# Altium footprint library PcbLib1.PcbLib: 54 footprints (part 4 of 4)
Each footprint in its own frame and in the unit in brackets; x right, y up, seen from the top. Pads: shape width x height; smd on the part's side, far side on the other; paste and mask are expansions set on the pad; w line width, h text height; cw(c..) or ccw(c..) is an arc to the next point about the centre after c.
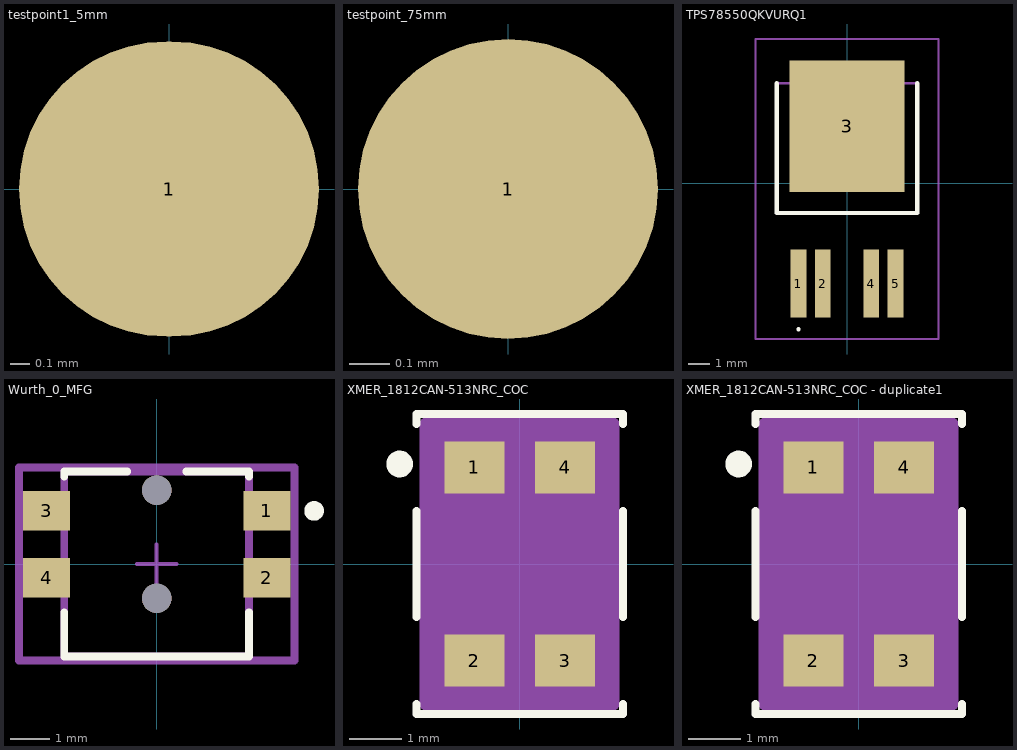
[diagram p3: the footprints below, top view; thin cyan lines are the x and y axes]

## testpoint1_5mm [mm]
pads (1):
  oval 1.524x1.5 smd: 1(0,0)

## testpoint_75mm [mm]
pads (1):
  round 0.75 smd: 1(0,0)

## TPS78550QKVURQ1 [mm]
pads (5):
  rect 0.75x3.2 smd: 1(-2.28,-4.71) 2(-1.14,-4.71) 4(1.14,-4.71) 5(2.28,-4.71)
  rect 5.4x6.2 smd: 3(0,2.69)
Top Overlay:
  lines w0.1: -2.28,-6.9 ccw(c-2.28,-6.85) -2.28,-6.8 ccw(c-2.28,-6.85) -2.28,-6.9
  lines w0.2: -3.3,4.71 -3.3,-1.385 3.3,-1.385 3.3,4.71
Mechanical 13:
  lines w0.1: -3.3,-1.385 -3.3,4.71 3.3,4.71 3.3,-1.385 -3.3,-1.385
Mechanical 15:
  lines w0.1: -4.3,-7.31 -4.3,6.79 4.3,6.79 4.3,-7.31 -4.3,-7.31
3D body "TPS78550QKVURQ1.stp": height 2.29, standoff -0.1, extent -3.291,-5.312 3.291,4.792

## Wurth_0_MFG [mm]
pads (6):
  rect 1.2x1 smd paste+0 mask+0: 1(2.8,1.35) 2(2.8,-0.35) 3(-2.8,1.35) 4(-2.8,-0.35)
  round 0.75 hole 0.75 unplated paste-2539.97 mask+0: ""(0,-0.875) ""(0,1.875)
Top Overlay:
  circle w0.25: c4,1.35 r0.125
  lines w0.2: -2.35,-1.225 -2.35,-2.35 2.35,-2.35 2.35,-1.225 ; -2.35,2.225 -2.35,2.35 -0.75,2.35 ; 0.75,2.35 2.35,2.35 2.35,2.225
Mechanical 10:
  lines w0.2: -3.5,-2.45 -3.5,2.45 3.5,2.45 3.5,-2.45 -3.5,-2.45
  text ".Designator" at 0,-0.001 h1
Mechanical 12:
  lines w0.2: -2.35,-2.35 -2.35,2.35 2.35,2.35 2.35,-2.35 -2.35,-2.35
Mechanical 15:
  lines w0.1: -0.5,0 0.5,0 ; 0,-0.5 0,0.5
  lines w0.2: -3.5,-2.45 -3.5,2.45 3.5,2.45 3.5,-2.45 -3.5,-2.45
3D body "Switch_Wurth_436331045822_eec.STEP": height 0.25, standoff 0, extent -3.5,-2.45 3.5,2.45
3D body "Switch_Wurth_436331045822_eec.STEP": height 1.65, standoff -0.5, extent -3.2,-2.25 3.2,2.25

## XMER_1812CAN-513NRC_COC [mil]
pads (4):
  rect 45x39 smd paste-19.5 mask+0: 1(-34,72.5) 2(-34,-72.5) 3(34,-72.5) 4(34,72.5)
Top Overlay:
  circle w10: c-90,75 r5
  lines w6: -77.5,-105.1 -77.5,-112.5 77.5,-112.5 77.5,-105.1 ; -77.5,-39.9 -77.5,39.9 ; -77.5,105.1 -77.5,112.5 77.5,112.5 77.5,105.1 ; 77.5,-39.9 77.5,39.9
Mechanical 13:
  lines w1: -62.5,47.5 -12.5,97.5 ; -62.5,-97.5 62.5,-97.5 62.5,97.5 -62.5,97.5 -62.5,-97.5
Mechanical 15:
  rectangle: -70,-105 70,105
  lines w10: -70,-105 -70,105 70,105 70,-105 -70,-105
3D body "Coilcraft-1812CAN - 1812CAN.STEP.step": height 118.11, standoff 0, extent -54.53,-89.96 54.53,89.96

## XMER_1812CAN-513NRC_COC - duplicate1 [mil]
pads (4):
  rect 45x39 smd paste-19.5 mask+0: 1(-34,72.5) 2(-34,-72.5) 3(34,-72.5) 4(34,72.5)
Top Overlay:
  circle w10: c-90,75 r5
  lines w6: -77.5,-105.1 -77.5,-112.5 77.5,-112.5 77.5,-105.1 ; -77.5,-39.9 -77.5,39.9 ; -77.5,105.1 -77.5,112.5 77.5,112.5 77.5,105.1 ; 77.5,-39.9 77.5,39.9
Mechanical 13:
  lines w1: -62.5,47.5 -12.5,97.5 ; -62.5,-97.5 62.5,-97.5 62.5,97.5 -62.5,97.5 -62.5,-97.5
Mechanical 15:
  rectangle: -70,-105 70,105
  lines w10: -70,-105 -70,105 70,105 70,-105 -70,-105
3D body "Coilcraft-1812CAN - 1812CAN.STEP.step": height 118.11, standoff 0, extent -54.53,-89.96 54.53,89.96